# Altium footprint library Connectors.PcbLib: 245 footprints (part 2 of 16)
Each footprint in its own frame and in the unit in brackets; x right, y up, seen from the top. Pads: shape width x height; smd on the part's side, far side on the other; paste and mask are expansions set on the pad; w line width, h text height; cw(c..) or ccw(c..) is an arc to the next point about the centre after c.
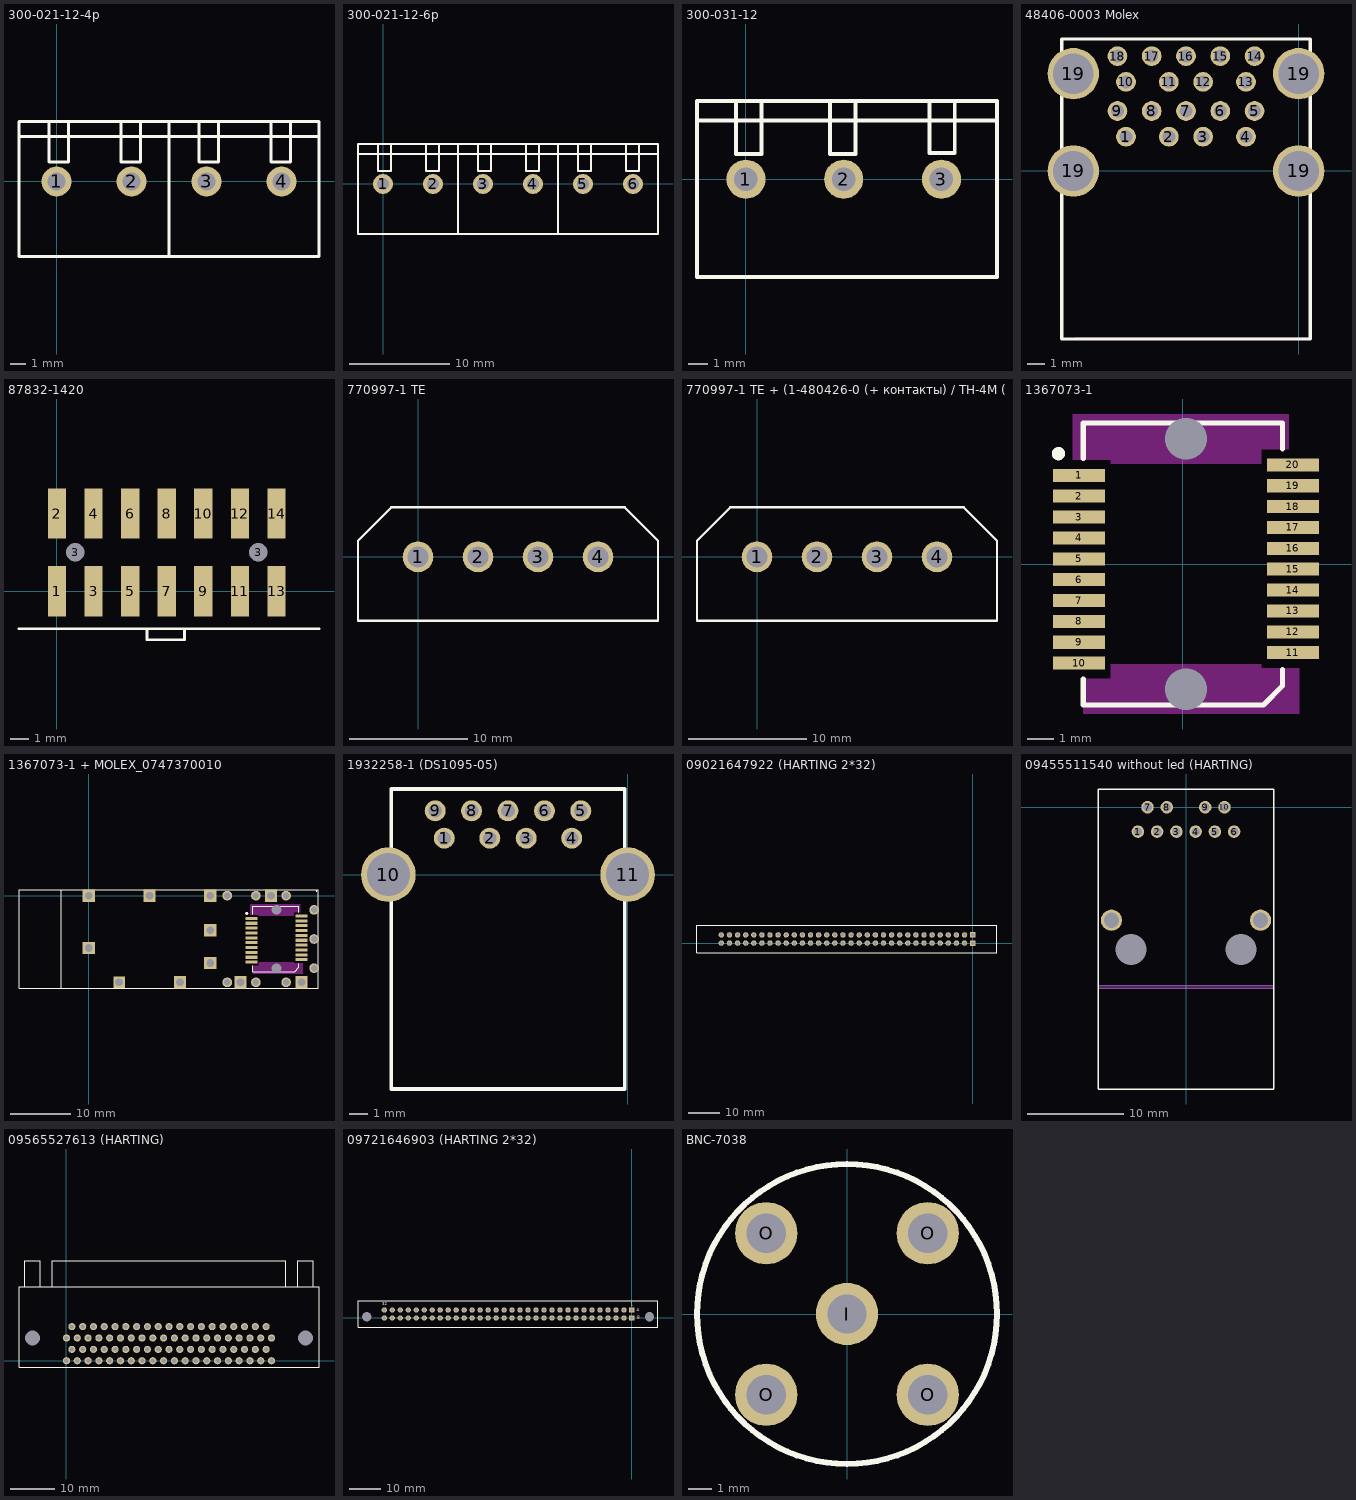
[diagram p1: the footprints below, top view; thin cyan lines are the x and y axes]

## 300-021-12-4p [mm]
pads (4):
  round 2 hole 1.2: 1(0,0) 2(5,0) 3(10,0) 4(15,0)
Top Overlay:
  lines w0.2: -2.5,3 7.5,3 17.5,3 ; -0.5,4 -0.5,1.3 0.8,1.3 0.8,4 ; 4.3,3.9 4.3,1.3 5.6,1.3 5.6,3.9 ; 9.5,4 9.5,1.3 10.8,1.3 10.8,4 ; 14.3,3.9 14.3,1.3 15.6,1.3 15.6,3.9 ; 7.5,-5 7.5,4 ; 7.5,-5 -2.5,-5 -2.5,4 7.5,4 ; 7.5,-5 17.5,-5 ; 7.5,-5 7.5,4 ; 7.5,4 17.5,4 ; 17.5,-5 17.5,4 ; 17.5,-5 17.5,4
3D body "TB-2_metric214.STEP": height 10.1, standoff -4, extent -2.45,-3.83 7.55,3.77
3D body "TB-2_metric214.STEP": height 10.1, standoff -4, extent 7.55,-3.83 17.55,3.77

## 300-021-12-6p [mm]
pads (6):
  round 2 hole 1.2: 1(0,0) 2(5,0) 3(10,0) 4(15,0) 5(20,0) 6(25,0)
Top Overlay:
  lines w0.2: -2.5,3 7.5,3 17.5,3 27.5,3 ; -0.5,4 -0.5,1.3 0.8,1.3 0.8,4 ; 4.3,3.9 4.3,1.3 5.6,1.3 5.6,3.9 ; 9.5,4 9.5,1.3 10.8,1.3 10.8,4 ; 14.3,3.9 14.3,1.3 15.6,1.3 15.6,3.9 ; 19.5,4 19.5,1.3 20.8,1.3 20.8,4 ; 24.3,3.9 24.3,1.3 25.6,1.3 25.6,3.9 ; 7.5,-5 7.5,4 ; 7.5,-5 -2.5,-5 -2.5,4 7.5,4 ; 7.5,-5 17.5,-5 ; 7.5,-5 7.5,4 ; 7.5,4 17.5,4 ; 17.5,-5 17.5,4 ; 17.5,-5 27.5,-5 27.5,4 17.5,4 ; 17.5,-5 17.5,4
3D body "TB-2_metric214.STEP": height 10.1, standoff -4, extent -2.45,-3.83 7.55,3.77
3D body "TB-2_metric214.STEP": height 10.1, standoff -4, extent 7.55,-3.83 17.55,3.77
3D body "TB-2_metric214.STEP": height 10.1, standoff -4, extent 17.55,-3.83 27.55,3.77

## 300-031-12 [mm]
pads (3):
  round 2 hole 1.2: 1(0,0) 2(5,0) 3(10,0)
Top Overlay:
  lines w0.2: -2.5,3 12.76,3 ; -0.5,4 -0.5,1.3 0.8,1.3 0.8,4 ; 4.3,3.9 4.3,1.3 5.6,1.3 5.6,3.9 ; 9.38,3.94 9.38,1.34 10.68,1.34 10.68,3.94 ; -2.5,-5 -2.5,4 12.84,4 12.84,-5 -2.5,-5
3D body "TB-3_metric214.STEP": height 10.1, standoff -4, extent -2.49,-3.843 12.51,3.757

## 48406-0003 Molex [mm]
pads (22):
  round 1.15 hole 0.75 unplated: 1(-10.07,2) 2(-7.57,2) 3(-5.57,2) 4(-3.07,2) 5(-2.57,3.5) 6(-4.57,3.5) 7(-6.57,3.5) 8(-8.57,3.5) 9(-10.57,3.5) 10(-10.07,5.2) 11(-7.57,5.2) 12(-5.57,5.2) 13(-3.07,5.2) 14(-2.57,6.7) 15(-4.57,6.7) 16(-6.57,6.7) 17(-8.57,6.7) 18(-10.57,6.7)
  round 3 hole 2.35 unplated: 19(-13.14,0) 19(-13.14,5.68) 19(0,0) 19(0,5.68)
Top Overlay:
  lines w0.2: -13.82,-9.8 -13.82,7.7 0.68,7.7 0.68,-9.8 -13.82,-9.8
Mechanical 1:
  lines w0.15: -12.99,-9.78 0.68,-9.78
  text "PCB EDGE" at -10,-9.18 h2
3D body "48406-0003.stp": height 16.22, standoff -3.18, extent -14.4,-9.45 1.27,8.01

## 87832-1420 [mm] "molex"
pads (16):
  rect 1x2.75 smd: 1(0,0) 2(0,4.25) 3(2,0) 4(2,4.25) 5(4,0) 6(4,4.25) 7(6,0) 8(6,4.25) 9(8,0) 10(8,4.25) 11(10,0) 12(10,4.25) 13(12,0) 14(12,4.25)
  round 0.8 hole 1 unplated: 3(1,2.13) 3(11,2.13)
Top Overlay:
  lines w0.15: -2.071,-2.042 14.318,-2.042 ; 4.906,-2.057 4.921,-2.057 4.921,-2.64 6.971,-2.64 6.971,-2.042
3D body "User Library-molex_87832-1420.STEP": height 7.6, standoff -0.75, extent -2.251,-1.02 14.399,5.28

## 770997-1 TE [mm]
pads (4):
  round 2.6 hole 1.8 unplated: 1(0,0) 2(5.08,0) 3(10.16,0) 4(15.24,0)
Top Overlay:
  lines w0.2: -5.08,-5.4 20.32,-5.4 20.32,1.37 17.49,4.2 -2.25,4.2 -5.08,1.37 -5.08,-5.4
3D body "c-0770997-01-c-3d.stp": height 11.6, standoff -3.89, extent -5.1,-5.461 20.3,4.191

## 770997-1 TE + (1-480426-0 (+ контакты) / TH-4M (KC-5081)) [mm]
pads (4):
  round 2.6 hole 1.8 unplated: 1(0,0) 2(5.08,0) 3(10.16,0) 4(15.24,0)
Top Overlay:
  lines w0.2: -5.08,-5.4 -5.08,1.37 -2.25,4.2 17.49,4.2 20.32,1.37 20.32,-5.4 -5.08,-5.4
3D body "c-1-480426-0-af-3d.stp": height -4.2, standoff -27.82, extent -5.257,-4.381 20.397,4.001
3D body "c-0770997-01-c-3d.stp": height 11.6, standoff -3.89, extent -5.1,-5.461 20.3,4.191

## 1367073-1 [mm]
pads (22):
  rect 2x0.5 smd: 1(-3.98,3.4) 2(-3.98,2.6) 3(-3.98,1.8) 4(-3.98,1) 5(-3.98,0.2) 6(-3.98,-0.6) 7(-3.98,-1.4) 8(-3.98,-2.2) 9(-3.98,-3) 10(-3.98,-3.8) 11(4.22,-3.4) 12(4.22,-2.6) 13(4.22,-1.8) 14(4.22,-1) 15(4.22,-0.2) 16(4.22,0.6) 17(4.22,1.4) 18(4.22,2.2) 19(4.22,3) 20(4.22,3.8)
  round 1 hole 1.6 unplated: ""(0.12,-4.8) ""(0.12,4.8)
Top Overlay:
  circle w0.254: c-4.77,4.23 r0.128
  lines w0.2: -3.82,-4.41 -3.82,-5.4 3.09,-5.4 3.82,-4.67 3.82,-4.04 ; -3.82,4.04 -3.82,5.4 3.82,5.4 3.82,4.41
Keep-Out Layer:
  region: -3.82,-5.75 -3.82,-4.4 -2.77,-4.4 -2.76,-4.39 -2.76,-3.84 2.999,-3.84 3.001,-3.99 4.45,-3.99 4.46,-4 4.46,-5.75
  region: 4.06,5.75 4.06,4.4 3.01,4.4 3,4.39 3,3.84 -2.759,3.84 -2.761,3.99 -4.21,3.99 -4.22,4 -4.22,5.75
3D body "c-1367073-1-f-3d.stp": height 5.2, standoff -0.8, extent -4.38,-5.51 4.62,5.49

## 1367073-1 + MOLEX_0747370010 [mm]
pads (42):
  rect 2x0.5 smd: 1(26.8,-3.73) 2(26.8,-4.53) 3(26.8,-5.33) 4(26.8,-6.13) 5(26.8,-6.93) 6(26.8,-7.73) 7(26.8,-8.53) 8(26.8,-9.33) 9(26.8,-10.13) 10(26.8,-10.93) 11(35,-10.53) 12(35,-9.73) 13(35,-8.93) 14(35,-8.13) 15(35,-7.33) 16(35,-6.53) 17(35,-5.73) 18(35,-4.93) 19(35,-4.13) 20(35,-3.33)
  rect 2x2 hole 1.3: ""(0,-8.58) ""(0,0) ""(10,0) ""(15,-14.25) ""(20,-11.08) ""(20,-5.68) ""(20,0) ""(25,-14.25) ""(30,0) ""(35,-14.25)
  rect 1.9x1.9 hole 1.3: ""(5,-14.25)
  round 1.6 hole 1.1: ""(22.8,-14.25) ""(22.8,0) ""(27.5,-14.25) ""(27.5,0) ""(32.5,-14.25) ""(32.5,0) ""(37.1,-11.93) ""(37.1,-7.13) ""(37.1,-2.33)
  round 1 hole 1.6 unplated: ""(30.9,-11.93) ""(30.9,-2.33)
Top Overlay:
  circle w0.254: c26.01,-2.9 r0.128
  lines w0.15: 37.518,0.638 37.518,0.99 37.8,0.99 37.8,-15.25 -4.5,-15.25 ; 37.8,1 -4.5,1 ; -4.5,-15.25 -11.477,-15.25 -11.477,1 -4.5,1 ; -4.5,-15.25 -4.5,1
  lines w0.2: 26.96,-11.54 26.96,-12.53 33.87,-12.53 34.6,-11.8 34.6,-11.17 ; 26.96,-3.09 26.96,-1.73 34.6,-1.73 34.6,-2.72
Keep-Out Layer:
  region: 34.84,-1.38 34.84,-2.73 33.79,-2.73 33.78,-2.74 33.78,-3.29 28.021,-3.29 28.019,-3.14 26.57,-3.14 26.56,-3.13 26.56,-1.38
  region: 26.96,-12.88 26.96,-11.53 28.01,-11.53 28.02,-11.52 28.02,-10.97 33.779,-10.97 33.781,-11.12 35.23,-11.12 35.24,-11.13 35.24,-12.88
3D body "747370010.stp": height 10.42, standoff -3.22, extent -11.477,-14.998 37.518,0.638
3D body "sfp-500-gmf.step": height 1.03, standoff -11.29, extent -19.816,-13.84 35.556,-0.251
3D body "c-1367073-1-f-3d.stp": height 5.2, standoff -0.8, extent 26.4,-12.64 35.4,-1.64

## 1932258-1 (DS1095-05) [mm]
pads (11):
  round 1.15 hole 0.75 unplated: 1(-10.07,2) 2(-7.57,2) 3(-5.57,2) 4(-3.07,2) 5(-2.57,3.5) 6(-4.57,3.5) 7(-6.57,3.5) 8(-8.57,3.5) 9(-10.57,3.5)
  round 3 hole 2.35 unplated: 10(-13.14,0) 11(0,0)
Top Overlay:
  lines w0.2: -12.988,-11.78 -12.988,4.7 -0.15,4.7 -0.15,-11.78 -12.988,-11.78
3D body "c-1932258-1-b-3d.stp": height 7.82, standoff -3.63, extent -14.637,-11.766 1.457,4.714

## 6116151-1 [mm]

## 09021647922 (HARTING 2*32) [mm]
pads (64):
  rect 1.7x1.7 hole 1.1: A1(0,0) B1(0,2.54)
  round 1.7 hole 1.1: A2(-2.54,0) A3(-5.08,0) A4(-7.62,0) A5(-10.16,0) A6(-12.7,0) A7(-15.24,0) A8(-17.78,0) A9(-20.32,0) A10(-22.86,0) A11(-25.4,0) A12(-27.94,0) A13(-30.48,0) A14(-33.02,0) A15(-35.56,0) A16(-38.1,0) A17(-40.64,0) A18(-43.18,0) A19(-45.72,0) A20(-48.26,0) A21(-50.8,0) A22(-53.34,0) A23(-55.88,0) A24(-58.42,0) A25(-60.96,0) A26(-63.5,0) A27(-66.04,0) A28(-68.58,0) A29(-71.12,0) A30(-73.66,0) A31(-76.2,0) A32(-78.74,0) B2(-2.54,2.54) B3(-5.08,2.54) B4(-7.62,2.54) B5(-10.16,2.54) B6(-12.7,2.54) B7(-15.24,2.54) B8(-17.78,2.54) B9(-20.32,2.54) B10(-22.86,2.54) B11(-25.4,2.54) B12(-27.94,2.54) B13(-30.48,2.54) B14(-33.02,2.54) B15(-35.56,2.54) B16(-38.1,2.54) B17(-40.64,2.54) B18(-43.18,2.54) B19(-45.72,2.54) B20(-48.26,2.54) B21(-50.8,2.54) B22(-53.34,2.54) B23(-55.88,2.54) B24(-58.42,2.54) B25(-60.96,2.54) B26(-63.5,2.54) B27(-66.04,2.54) B28(-68.58,2.54) B29(-71.12,2.54) B30(-73.66,2.54) B31(-76.2,2.54) B32(-78.74,2.54)
Top Overlay:
  lines w0.3: -86.37,-2.98 7.63,-2.98 7.63,1.27 7.63,5.52 -86.37,5.52 -86.37,1.27 -86.37,-2.98

## 09455511540 without led (HARTING) [mm]
pads (14):
  round 1.3 hole 0.9: 1(-5,-2.54) 2(-3,-2.54) 3(-1,-2.54) 4(1,-2.54) 5(3,-2.54) 6(5,-2.54) 7(-4,0) 8(-2,0) 9(2,0) 10(4,0)
  round 2.2 hole 1.6: Chield(-7.75,-11.75) Chield(7.75,-11.75)
  round 2.1 hole 3.2 unplated: ""(-5.715,-14.8) ""(5.715,-14.8)
Top Overlay:
  lines w0.15: -9.1,-29.3 9.1,-29.3 ; -9.1,-29.296 -9.1,1.898 9.1,1.898 9.1,-29.296
Mechanical 1:
  lines w0.15: -9.12,-18.8 9.12,-18.8 ; -9.1,-18.55 9.1,-18.55
  text "PCB EDGE MAX" at -5.55,-20.31 h2
  text "PCB EDGE 3.75" at -5.57,-18.25 h2
3D body "09455511540_100655294MOD000A.STP": height 11.75, standoff -3.67, extent -7.877,-29.247 7.873,1.753

## 09565527613 (HARTING) [mm]
pads (80):
  round 1.6 hole 1: 1(0,0) 2(2.41,0) 3(4.82,0) 4(7.23,0) 5(9.64,0) 6(12.05,0) 7(14.46,0) 8(16.87,0) 9(19.28,0) 10(21.69,0) 11(24.1,0) 12(26.51,0) 13(28.92,0) 14(31.33,0) 15(33.74,0) 16(36.15,0) 17(38.56,0) 18(40.97,0) 19(43.38,0) 20(45.79,0) 21(1.205,2.54) 22(3.615,2.54) 23(6.025,2.54) 24(8.435,2.54) 25(10.845,2.54) 26(13.255,2.54) 27(15.665,2.54) 28(18.075,2.54) 29(20.485,2.54) 30(22.895,2.54) 31(25.305,2.54) 32(27.715,2.54) 33(30.125,2.54) 34(32.535,2.54) 35(34.945,2.54) 36(37.355,2.54) 37(39.765,2.54) 38(42.175,2.54) 39(44.585,2.54) 40(0,5.08) 41(2.41,5.08) 42(4.82,5.08) 43(7.23,5.08) 44(9.64,5.08) 45(12.05,5.08) 46(14.46,5.08) 47(16.87,5.08) 48(19.28,5.08) 49(21.69,5.08) 50(24.1,5.08) 51(26.51,5.08) 52(28.92,5.08) 53(31.33,5.08) 54(33.74,5.08) 55(36.15,5.08) 56(38.56,5.08) 57(40.97,5.08) 58(43.38,5.08) 59(45.79,5.08) 60(1.205,7.62) 61(3.615,7.62) 62(6.025,7.62) 63(8.435,7.62) 64(10.845,7.62) 65(13.255,7.62) 66(15.665,7.62) 67(18.075,7.62) 68(20.485,7.62) 69(22.895,7.62) 70(25.305,7.62) 71(27.715,7.62) 72(30.125,7.62) 73(32.535,7.62) 74(34.945,7.62) 75(37.355,7.62) 76(39.765,7.62) 77(42.175,7.62) 78(44.585,7.62)
  round 1.6 hole 3.4: ""(-7.605,5.08) ""(53.395,5.08)
Top Overlay:
  lines w0.2: -9.3,16.51 -9.3,22.3 ; -9.3,22.31 -5.9,22.31 -5.9,16.53 ; -3.22,22.31 48.995,22.31 48.995,16.51 ; -3.205,16.51 -3.205,22.31 ; 51.69,16.51 51.69,22.31 55.1,22.31 55.1,16.51 ; 56.395,16.475 56.395,5.08 56.395,-1.43 -2.73,-1.43 -10.605,-1.43 -10.605,5.08 -10.605,16.51 1.205,16.51 56.395,16.51
3D body "0956552X613_100222214MOD000A.STP": height 16.4, standoff -3.35, extent -10.84,-1.55 56.56,22.65

## 09721646903 (HARTING 2*32) [mm]
pads (66):
  round 1.6 hole 3: 10(-84.34,0.4) 10(5.6,0.4)
  rect 1.7x1.7 hole 1.1: A1(0,2.54) B1(0,0)
  round 1.7 hole 1.1: A2(-2.54,2.54) A3(-5.08,2.54) A4(-7.62,2.54) A5(-10.16,2.54) A6(-12.7,2.54) A7(-15.24,2.54) A8(-17.78,2.54) A9(-20.32,2.54) A10(-22.86,2.54) A11(-25.4,2.54) A12(-27.94,2.54) A13(-30.48,2.54) A14(-33.02,2.54) A15(-35.56,2.54) A16(-38.1,2.54) A17(-40.64,2.54) A18(-43.18,2.54) A19(-45.72,2.54) A20(-48.26,2.54) A21(-50.8,2.54) A22(-53.34,2.54) A23(-55.88,2.54) A24(-58.42,2.54) A25(-60.96,2.54) A26(-63.5,2.54) A27(-66.04,2.54) A28(-68.58,2.54) A29(-71.12,2.54) A30(-73.66,2.54) A31(-76.2,2.54) A32(-78.74,2.54) B2(-2.54,0) B3(-5.08,0) B4(-7.62,0) B5(-10.16,0) B6(-12.7,0) B7(-15.24,0) B8(-17.78,0) B9(-20.32,0) B10(-22.86,0) B11(-25.4,0) B12(-27.94,0) B13(-30.48,0) B14(-33.02,0) B15(-35.56,0) B16(-38.1,0) B17(-40.64,0) B18(-43.18,0) B19(-45.72,0) B20(-48.26,0) B21(-50.8,0) B22(-53.34,0) B23(-55.88,0) B24(-58.42,0) B25(-60.96,0) B26(-63.5,0) B27(-66.04,0) B28(-68.58,0) B29(-71.12,0) B30(-73.66,0) B31(-76.2,0) B32(-78.74,0)
Top Overlay:
  lines w0.3: -87.1,-2.98 -87.1,0.82 -87.1,5.52 8.3,5.52 8.3,4.37 8.3,-2.98 -87.1,-2.98
  text "32" at -79.4,3.7 h1.52
  text "1" at -0.3,3.6 h1.52
  text "B" at 1.7,-0.6 h1.52
  text "A" at 1.6,1.9 h1.52
Bottom Overlay:
  text "1" at 0.3,3.7 h1.52
  text "32" at -78,3.7 h1.52
  text "A" at 2.4,1.9 h1.52
  text "B" at 2.4,-0.6 h1.52
3D body "09721326913.stp": height 11.6, standoff -4, extent -86.8,-2.9 8.2,5.7

## BNC-7038 [mm]
pads (5):
  round 2.7 hole 1.7: I(0,0) O(-3.5,-3.5) O(-3.5,3.5) O(3.5,-3.5) O(3.5,3.5)
Top Overlay:
  circle w0.254: c0,0 r6.5
3D body "SW3dPS-MALE BNC CONNECTOR.STEP": height 62.14, standoff 7.09, extent -9.236,-9.348 9.158,9.041
3D body "User Library-My BNC Medium.step": height 17.95, standoff -4.4, extent -8.004,-7.824 7.524,7.704